# Altium footprint library 04.连接器件.pcb.PCBLIB: 363 footprints (part 23 of 23)
Each footprint in its own frame and in the unit in brackets; x right, y up, seen from the top. Pads: shape width x height; smd on the part's side, far side on the other; paste and mask are expansions set on the pad; w line width, h text height; cw(c..) or ccw(c..) is an arc to the next point about the centre after c.
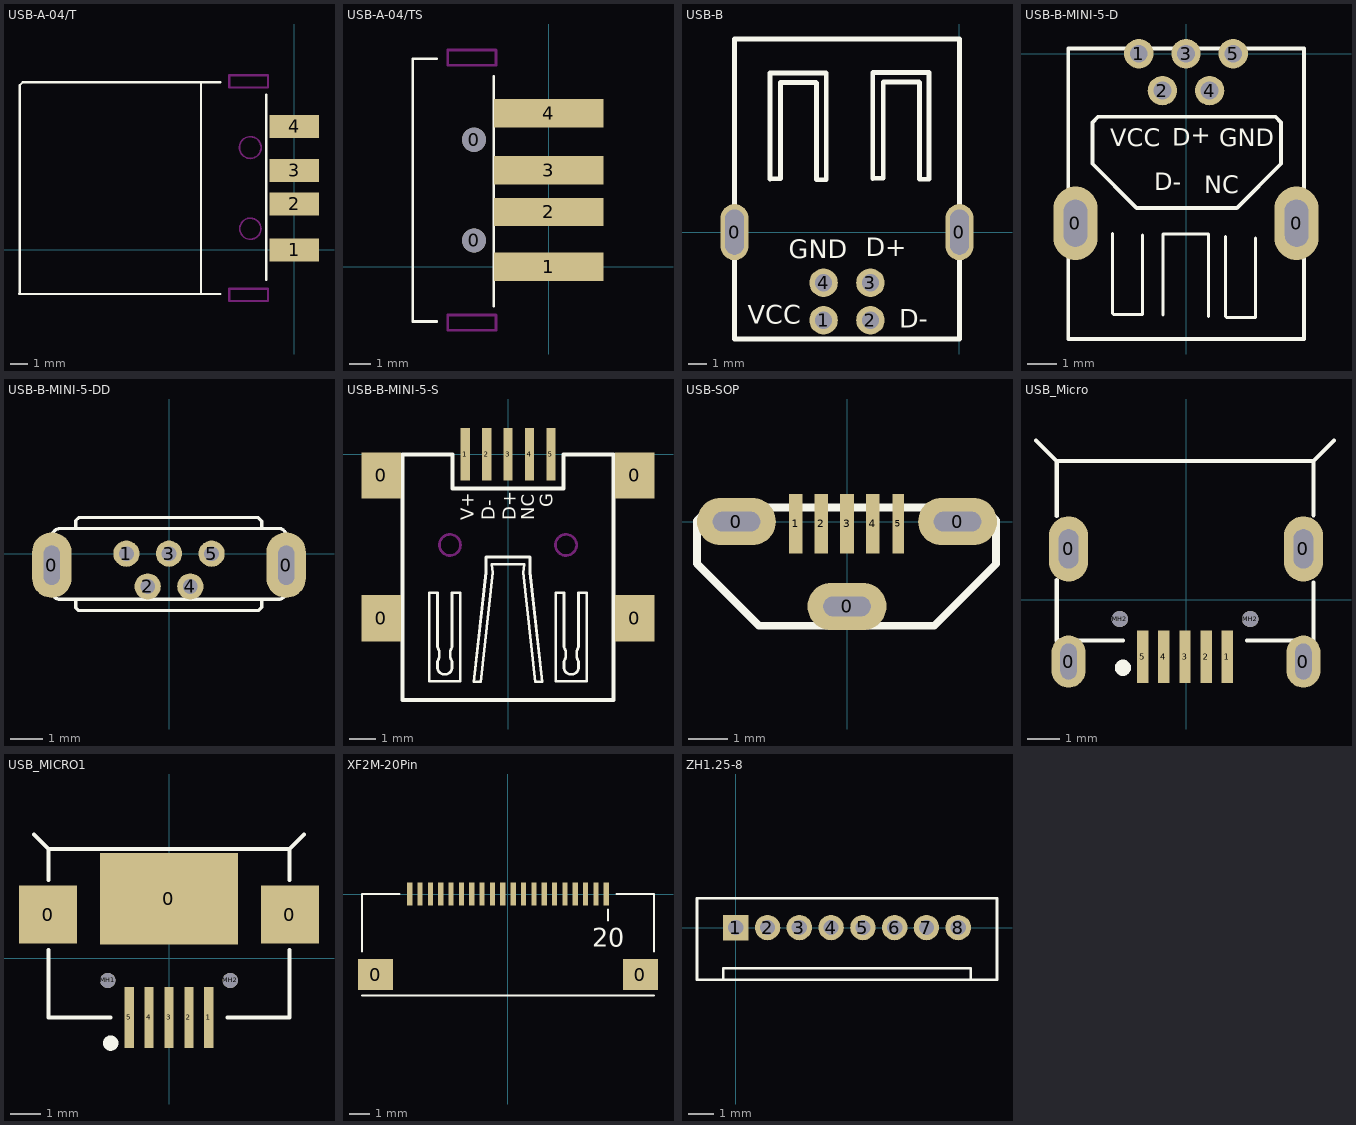
[diagram p22: the footprints below, top view; thin cyan lines are the x and y axes]

## USB-A-04/T [mm]
pads (4):
  rect 2.8x1.3 smd: 1(0,0) 2(0,2.6) 3(0,4.5) 4(0,7)
TopOverlay:
  lines w0.127: -4.192,-2.5 -5.292,-2.5 ; -4.192,9.5 -5.292,9.5 ; -1.592,-1.7 -1.592,8.8 ; -5.292,-2.5 -15.601,-2.5 -15.562,-2.461 -15.562,9.325 -15.387,9.5 -5.292,9.5 ; -5.292,-2.5 -5.292,-1.5 -5.292,9.5
KeepOutLayer:
  circle w0.1: c-2.492,5.8 r0.616
  circle w0.1: c-2.492,1.2 r0.598
  lines w0.127: -3.692,-2.8 -3.692,-2.2 ; -3.692,9.3 -3.692,9.9 ; -3.692,-2.2 -3.692,-2.9 -1.492,-2.9 -1.492,-2.2 -3.692,-2.2 ; -3.692,9.9 -3.692,9.2 -1.492,9.2 -1.492,9.9 -3.692,9.9
MultiLayer:
  rectangle: -4.192,-3.4 -0.992,-2.9
  rectangle: -4.192,-2.2 -0.992,-1.7
  rectangle: -1.492,-3.4 -0.992,-1.7
  rectangle: -4.192,-3.4 -3.692,-1.7
  rectangle: -4.192,8.8 -0.992,9.2
  rectangle: -4.192,9.9 -0.992,10.3
  rectangle: -1.492,8.8 -0.992,10.3
  rectangle: -4.192,8.8 -3.692,10.3

## USB-A-04/TS [mm]
pads (6):
  round 1.1 hole 1.1: 0(-3.4,1.2) 0(-3.4,5.8)
  rect 5x1.3 smd: 1(0,0) 2(0,2.5) 3(0,4.4) 4(0,7)
TopOverlay:
  lines w0.127: -5.1,-2.5 -6.2,-2.5 -6.2,8.5 -6.2,9.5 -5.1,9.5 ; -2.5,-1.8 -2.5,8.7
KeepOutLayer:
  lines w0.127: -4.6,-2.3 -4.6,-2.9 ; -4.6,9.8 -4.6,9.2 ; -4.6,-2.9 -4.6,-2.2 -2.4,-2.2 -2.4,-2.9 -4.6,-2.9 ; -4.6,9.2 -4.6,9.9 -2.4,9.9 -2.4,9.2 -4.6,9.2
MultiLayer:
  rectangle: -5.1,9.9 -1.9,10.4
  rectangle: -5.1,8.7 -1.9,9.2
  rectangle: -2.4,8.7 -1.9,10.4
  rectangle: -5.1,8.7 -4.6,10.4
  rectangle: -5.1,-2.2 -1.9,-1.8
  rectangle: -5.1,-3.3 -1.9,-2.9
  rectangle: -2.4,-3.3 -1.9,-1.8
  rectangle: -5.1,-3.3 -4.6,-1.8

## USB-B [mm]
pads (6):
  oval 1.5x3 hole 1 slot 2.4 at 90 deg: 0(-12,0) 0(0,0)
  round 1.524 hole 0.92: 1(-7.25,-4.7) 2(-4.75,-4.7) 3(-4.75,-2.7) 4(-7.25,-2.7)
TopOverlay:
  lines w0.254: -12,-5.7 -12,10.3 0,10.3 0,-5.7 -12,-5.7 ; -10.109,2.819 -10.084,2.845 -9.55,2.845 -9.55,7.976 -7.645,7.976 -7.62,7.95 -7.62,2.794 -7.112,2.794 -7.112,8.484 -10.109,8.484 -10.109,2.819 ; -4.623,2.845 -4.623,8.509 -1.626,8.509 -1.626,2.819 -2.134,2.819 -2.134,7.976 -2.159,8.001 -4.064,8.001 -4.064,2.87 -4.597,2.87 -4.623,2.845
  text "VCC" at -11.3,-4.9 h1
  text "D-" at -3.2,-5.1 h1
  text "D+" at -5,-1.3 h1
  text "GND" at -9.1,-1.4 h1
BottomOverlay:
  text "D-" at -1.8,-5.1 h1
  text "VCC" at -8.6,-5 h1
  text "D+" at -3.8,-1.2 h1
  text "GND" at -6.5,-1.3 h1
3D body "USB-BB2P-401-90.STEP": height 11, standoff -3.29, extent -12.751,-5.991 0.688,10.309

## USB-B-MINI-5-D [mm]
pads (7):
  oval 1.5x2.5 hole 0.8 slot 1.6 at 90 deg: 0(-3.75,-5.75)
  oval 1.5x2.5 hole 0.8 slot 1.6 at 90.8 deg: 0(3.75,-5.75)
  round 1 hole 0.6: 1(-1.6,0) 2(-0.8,-1.25) 3(0,0) 4(0.8,-1.25) 5(1.6,0)
TopOverlay:
  lines w0.1: -2.489,-6.096 -2.489,-8.814 -2.464,-8.839 -1.473,-8.839 -1.473,-6.147 ; -0.787,-8.865 -0.787,-6.121 0.762,-6.121 0.762,-8.915 ; 1.346,-6.198 1.346,-8.915 1.372,-8.941 2.362,-8.941 2.362,-6.248
  lines w0.127: -3.997,-9.677 4.003,-9.677 4.003,0.178 -3.997,0.178 -3.997,-9.677 ; -3.175,-3.734 -1.675,-5.234 1.725,-5.234 3.225,-3.734 3.225,-2.334 3.025,-2.134 -2.975,-2.134 -3.175,-2.334 -3.175,-3.734
  text "VCC" at -2.575,-3.134 h0.6
  text "D-" at -1.075,-4.634 h0.6
  text "D+" at -0.475,-2.534 h0.6
  text "GND" at 1.125,-3.134 h0.6
  text "NC" at 0.625,-4.734 h0.6
BottomOverlay:
  text "D-" at -0.375,-4.034 h0.6
  text "VCC" at -1.075,-3.134 h0.6
  text "D+" at 0.325,-3.134 h0.6
  text "GND" at 2.625,-3.134 h0.6
  text "NC" at 1.525,-4.134 h0.6
3D body "mini5USB1.STEP": height 4, standoff -2.1, extent -3.888,-9.648 3.962,0.152

## USB-B-MINI-5-DD [mm]
pads (7):
  oval 1.2x2 hole 0.5 slot 1.2 at 90 deg: 0(-3.575,-0.35) 0(3.575,-0.35)
  round 0.8 hole 0.45: 1(-1.3,0) 2(-0.65,-1) 3(0,0) 4(0.65,-1) 5(1.3,0)
TopOverlay:
  lines w0.1: -3.325,0.764 ccw(c-3.325,0.514) -3.575,0.514 -3.575,-0.35 -3.575,-1.145 ccw(c-3.328,-1.145) -3.328,-1.392 3.347,-1.392 ccw(c3.347,-1.168) 3.571,-1.168 ; -3.325,0.769 3.348,0.769 ; -2.846,-1.394 -2.846,-1.65 -2.765,-1.731 2.742,-1.731 2.833,-1.64 2.833,-1.392 ; -2.846,0.78 -2.846,1.011 -2.758,1.099 2.727,1.099 2.833,0.993 2.833,0.776 ; 3.347,0.769 cw(c3.348,0.542) 3.575,0.544 ; 3.575,-1.168 3.575,-0.35 3.575,0.542
3D body: height 1.2, standoff 0, extent 3.439,-0.686 3.711,-0.014
3D body: height 1.2, standoff 0, extent -3.711,-0.686 -3.439,-0.014
3D body: height 1.2, standoff 0, extent -0.777,-1.1 -0.523,-0.9
3D body: height 1.2, standoff 0, extent 0.523,-1.1 0.777,-0.9
3D body: height 1.2, standoff 0, extent 1.173,-0.1 1.427,0.1
3D body: height 1.2, standoff 0, extent -0.127,-0.1 0.127,0.1
3D body: height 1.2, standoff 0, extent -1.427,-0.1 -1.173,0.1
3D body: height 5.65, standoff 0, extent -3.575,-1.392 3.575,0.769

## USB-B-MINI-5-S [mm]
pads (9):
  rect 1.5x1.75 smd: 0(-4.804,-6.2) 0(-4.804,-0.8) 0(4.796,-6.2) 0(4.796,-0.8)
  rect 0.35x2 smd: 1(-1.62,0) 2(-0.81,0) 3(0,0) 4(0.81,0) 5(1.62,0)
TopOverlay:
  lines w0.1: -2.676,-8.048 ccw(c-2.397,-8.048) -2.117,-8.048 ; -2.672,-8.044 -2.672,-7.845 ccw(c-3.184,-7.563) -2.672,-7.282 -2.672,-5.232 -2.981,-5.232 -2.981,-8.582 -1.813,-8.582 -1.813,-5.232 -2.121,-5.232 -2.121,-7.282 ccw(c-1.609,-7.563) -2.121,-7.845 -2.121,-8.044 ; 2.109,-8.048 ccw(c2.389,-8.048) 2.668,-8.048 ; 2.113,-8.044 2.113,-7.845 ccw(c1.601,-7.563) 2.113,-7.282 2.113,-5.232 1.805,-5.232 1.805,-8.582 2.973,-8.582 2.973,-5.232 2.664,-5.232 2.664,-7.282 ccw(c3.176,-7.563) 2.664,-7.845 2.664,-8.044 ; -1.295,-8.611 -0.838,-4.47 -0.838,-3.886 0.83,-3.886 0.83,-4.47 1.287,-8.611 1.033,-8.611 0.576,-4.47 0.61,-4.166 -0.618,-4.166 -0.584,-4.47 -1.041,-8.611 -1.295,-8.611
  lines w0.15: -4.004,-9.3 3.996,-9.3 3.996,0 2.096,0 2.096,-1.3 -2.104,-1.3 -2.104,0 -4.004,0 -4.004,-9.3
  text "NC" at 0.996,-2.5 h0.5
  text "D+" at 0.296,-2.5 h0.5
  text "D-" at -0.504,-2.5 h0.5
  text "G" at 1.696,-2 h0.5
  text "V+" at -1.304,-2.5 h0.5
KeepOutLayer:
  circle w0.1: c2.191,-3.43 r0.4
  circle w0.1: c-2.199,-3.43 r0.4
3D body: height 2.5, standoff 0, extent -4.004,-9.3 3.996,0

## USB-SOP [mm]
pads (8):
  oval 2x1.2 hole 0.5 slot 1.2 at 0 deg: 0(-2.8,0) 0(0,-2.15) 0(2.8,0)
  rect 0.35x1.5 smd: 1(-1.3,-0.056) 2(-0.65,-0.056) 3(0,-0.056) 4(0.65,-0.056)
  rect 0.3x1.5 smd: 5(1.3,-0.056)
TopOverlay:
  lines w0.2: -3.8,-1.066 -2.227,-2.64 2.208,-2.64 3.779,-1.069 3.779,0.029 3.455,0.353 -3.461,0.353 -3.8,0.014 -3.8,-1.066
3D body: height 6.7, standoff 0, extent -3.825,-2.64 3.754,0.353
3D body: height 0.5, standoff -0.2, extent -3.149,-0.141 -2.448,0.185
3D body: height 0.5, standoff -0.2, extent 2.45,-0.163 3.151,0.163
3D body: height 0.5, standoff -0.2, extent -0.35,-2.313 0.351,-1.987
3D body: height 0.1, standoff 0, extent -1.449,-0.736 -1.157,0.594
3D body: height 0.1, standoff 0, extent -0.777,-0.683 -0.521,0.593
3D body: height 0.1, standoff 0, extent -0.129,-0.646 0.135,0.594
3D body: height 0.1, standoff 0, extent 0.512,-0.621 0.786,0.594
3D body: height 0.1, standoff 0, extent 1.199,-0.615 1.424,0.594

## USB_Micro [mm] "5P 贴片 带定位柱"
pads (11):
  oval 1.05x1.6 hole 0.5 slot 1.1 at 90 deg: 0(-3.602,-1.904) 0(3.602,-1.904)
  oval 1.2x2 hole 0.6 slot 1.2 at 90 deg: 0(-3.602,1.554) 0(3.602,1.554)
  rect 0.35x1.6 smd: 1(1.271,-1.754) 2(0.621,-1.754) 3(-0.029,-1.754) 4(-0.679,-1.754) 5(-1.329,-1.754)
  round 0.5 hole 0.5 unplated: MH2(-2.029,-0.6) MH2(1.971,-0.6)
TopOverlay:
  circle w0.25: c-1.934,-2.094 r0.125
  lines w0.127: -4.596,4.884 -3.966,4.254 -3.966,2.559 ; -3.966,0.603 -3.966,-1.254 -1.934,-1.254 ; -3.929,4.254 3.871,4.254 ; 1.876,-1.254 3.871,-1.254 ; 3.908,-1.254 3.908,0.527 ; 3.908,2.584 3.908,4.254 4.538,4.884
3D body: height 2.7, standoff 0, extent -4.596,4.254 4.538,4.884
3D body: height 2.5, standoff 0, extent -3.929,-1.254 3.908,4.254

## USB_MICRO1 [mm]
pads (10):
  rect 1.9x1.9 smd: 0(-3.95,1.42) 0(3.95,1.42)
  rect 4.5x3 smd: 0(0,1.938)
  rect 0.3x2 smd: 1(1.3,-1.937) 2(0.65,-1.937) 3(0,-1.938) 4(-0.65,-1.937) 5(-1.3,-1.937)
  round 0.5 hole 0.5 unplated: MH1(-2,-0.73) MH2(2,-0.73)
TopOverlay:
  circle w0.25: c-1.905,-2.778 r0.125
  lines w0.127: -4.408,4.042 -3.937,3.57 -3.937,2.554 ; -3.937,-1.937 -3.937,0.268 ; -3.9,-1.937 -1.905,-1.937 ; -3.9,3.57 3.9,3.57 ; 1.905,-1.937 3.9,-1.937 ; 3.937,-1.937 3.937,0.268 ; 3.937,2.554 3.937,3.57 4.408,4.042
3D body: height 0.12, standoff 0, extent 1.15,-2.975 1.45,-0.9
3D body: height 0.12, standoff 0, extent 0.5,-2.975 0.8,-0.9
3D body: height 0.12, standoff 0, extent -0.15,-2.975 0.15,-0.9
3D body: height 0.12, standoff 0, extent -0.8,-2.975 -0.5,-0.9
3D body: height 2.5, standoff 0, extent -3.9,-1.937 3.937,3.57
3D body: height 2.7, standoff 0, extent -4.43,3.425 4.43,4.055
3D body: height 0.12, standoff 0, extent -1.45,-2.975 -1.15,-0.9

## XF2M-20Pin [mm] "XF2M-20Pin  pich0.5"
pads (22):
  rect 1.7x1.5 smd: 0(-6.4,-3.9) 0(6.4,-3.9)
  rect 0.25x1.1 smd: 1(-4.75,0) 2(-4.25,0) 3(-3.75,0) 4(-3.25,0) 5(-2.75,0) 6(-2.25,0) 7(-1.75,0) 8(-1.25,0) 9(-0.75,0) 10(-0.25,0) 11(0.25,0) 12(0.75,0) 13(1.25,0) 14(1.75,0) 15(2.25,0) 16(2.75,0) 17(3.25,0) 18(3.75,0) 19(4.25,0) 20(4.75,0)
TopOverlay:
  lines w0.1: -7.05,-4.9 7.05,-4.9 ; -7.05,-2.782 -7.05,0 -5.25,0 ; 4.826,-1.27 4.826,-0.762 ; 5.25,0 7.05,0 7.05,-2.782
  text "20" at 4.064,-2.54 h0.9

## ZH1.25-8 [mm]
pads (8):
  rect 1x1 hole 0.6: 1(0,0)
  round 1 hole 0.6: 2(1.25,0) 3(2.5,0) 4(3.75,0) 5(5,0) 6(6.25,0) 7(7.5,0) 8(8.75,0)
TopOverlay:
  lines w0.1: -0.5,-2.05 -0.5,-1.6 9.25,-1.6 9.25,-2.05 ; -1.525,-2.05 -1.525,1.15 10.275,1.15 10.275,-2.05 -1.525,-2.05
3D body "SIP8(1.25).STEP": height 4.6, standoff -2.3, extent -1.525,-2.057 10.275,1.143